# Altium footprint library EXTRA.PcbLib: 19 footprints (part 2 of 2)
Each footprint in its own frame and in the unit in brackets; x right, y up, seen from the top. Pads: shape width x height; smd on the part's side, far side on the other; paste and mask are expansions set on the pad; w line width, h text height; cw(c..) or ccw(c..) is an arc to the next point about the centre after c.
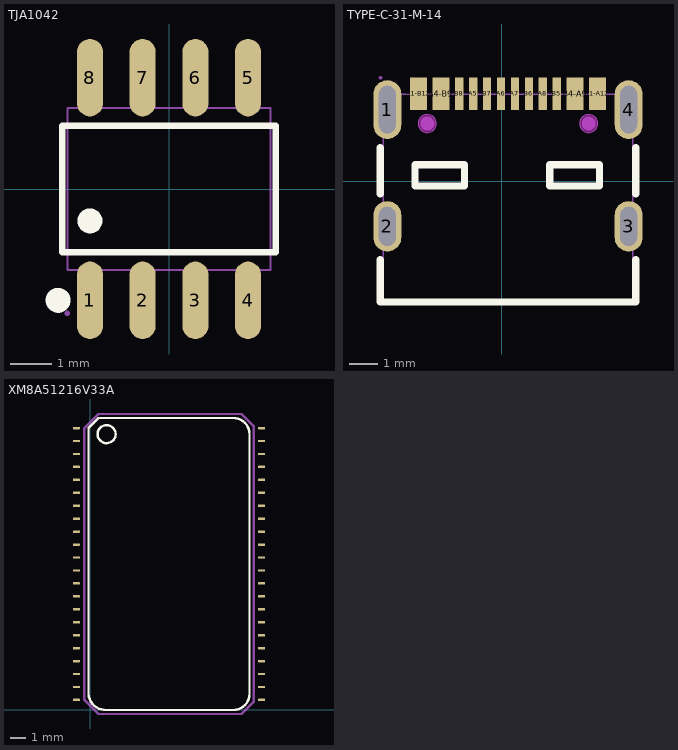
[diagram p1: the footprints below, top view; thin cyan lines are the x and y axes]

## TJA1042 [mm] "CAN PHY芯片，最高速度1M"
pads (8):
  oval 0.63x1.865 smd: 1(-1.905,-2.682) 2(-0.635,-2.682) 3(0.635,-2.682) 4(1.905,-2.682) 5(1.905,2.682) 6(0.635,2.682) 7(-0.635,2.682) 8(-1.905,2.682)
Top Overlay:
  circle w0.3: c-2.672,-2.682 r0.15
  circle w0.3: c-1.905,-0.769 r0.15
  lines w0.152: -2.576,-1.521 2.576,-1.521 2.576,1.521 -2.576,1.521 -2.576,-1.521
Mechanical 15:
  region: -2.115,-3 -2.115,-2.165 -1.695,-2.165 -1.695,-3
  region: -2.115,-2.175 -2.115,-1.94 -1.695,-1.94 -1.695,-2.175
  region: -0.845,-3 -0.845,-2.165 -0.425,-2.165 -0.425,-3
  region: -0.845,-2.175 -0.845,-1.94 -0.425,-1.94 -0.425,-2.175
  region: 0.425,-3 0.425,-2.165 0.845,-2.165 0.845,-3
  region: 0.425,-2.175 0.425,-1.94 0.845,-1.94 0.845,-2.175
  region: 1.695,-3 1.695,-2.165 2.115,-2.165 2.115,-3
  region: 1.695,-2.175 1.695,-1.94 2.115,-1.94 2.115,-2.175
  region: -2.115,2.165 -2.115,3 -1.695,3 -1.695,2.165
  region: -2.115,1.94 -2.115,2.175 -1.695,2.175 -1.695,1.94
  region: -0.845,2.165 -0.845,3 -0.425,3 -0.425,2.165
  region: -0.845,1.94 -0.845,2.175 -0.425,2.175 -0.425,1.94
  region: 0.425,2.165 0.425,3 0.845,3 0.845,2.165
  region: 0.425,1.94 0.425,2.175 0.845,2.175 0.845,1.94
  region: 1.695,2.165 1.695,3 2.115,3 2.115,2.165
  region: 1.695,1.94 1.695,2.175 2.115,2.175 2.115,1.94
  region: -2.39,-3 -2.39,-2.975 -2.425,-2.94 -2.475,-2.94 -2.51,-2.975 -2.51,-3 -2.51,-3.025 -2.475,-3.06 -2.425,-3.06 -2.39,-3.025
  lines w0.051: -2.45,-1.95 2.45,-1.95 2.45,1.95 -2.45,1.95 -2.45,-1.95
3D body "123.stp": height 1.67, standoff -0.05, extent -2.39,-3 2.425,3

## TYPE-C-31-M-14 [mm] "TYPE-C插头"
pads (16):
  oval 1x2.1 hole 0.6 slot 1.7 at 90 deg paste+0 mask+0.05: 1(-4.103,2.57) 4(4.537,2.57)
  oval 1x1.8 hole 0.6 slot 1.4 at 90 deg paste+0 mask+0.05: 2(-4.103,-1.61) 3(4.537,-1.61)
  rect 0.6x1.15 smd paste-100 mask+0.05: A1-B12(-2.983,3.134) A4-B9(-2.183,3.134) B1-A12(3.417,3.134) B4-A9(2.617,3.134)
  rect 0.3x1.15 smd paste-100 mask+0.05: A5(-1.033,3.134) A6(-0.033,3.134) A7(0.467,3.134) A8(1.467,3.134) B5(1.967,3.134) B6(0.967,3.134) B7(-0.533,3.134) B8(-1.533,3.134)
Top Overlay:
  lines w0.254: -4.355,-2.794 -4.355,-4.318 4.789,-4.318 4.789,-2.794 ; -4.355,-0.445 -4.355,1.206 ; 4.789,-0.445 4.789,1.206 ; -3.113,-0.168 -1.335,-0.168 -1.335,0.594 -3.113,0.594 -3.113,-0.168 ; 1.713,-0.168 3.491,-0.168 3.491,0.594 1.713,0.594 1.713,-0.168
Top Paste:
  drawing of 16 lines, arcs and shapes, not listed
Keep-Out Layer:
  board cut-out: 3.432,2.069 3.432,2.134 3.383,2.254 3.291,2.345 3.172,2.395 3.042,2.395 2.923,2.345 2.832,2.254 2.782,2.134 2.782,2.07 2.782,2.005 2.832,1.885 2.923,1.794 3.042,1.745 3.172,1.745 3.291,1.794 3.383,1.885 3.432,2.005
  board cut-out: -2.348,2.069 -2.348,2.134 -2.397,2.254 -2.489,2.345 -2.608,2.395 -2.738,2.395 -2.857,2.345 -2.948,2.254 -2.998,2.134 -2.998,2.07 -2.998,2.005 -2.949,1.885 -2.857,1.794 -2.738,1.745 -2.608,1.745 -2.489,1.794 -2.397,1.885 -2.348,2.005
Mechanical 1:
  circle w0.005: c3.107,2.069 r0.325
  circle w0.005: c-2.673,2.069 r0.325
Mechanical 6:
  circle w0.25: c3.107,2.069 r0.125
  circle w0.25: c-2.673,2.069 r0.125
Mechanical 15:
  region: -4.283,3.71 -4.283,3.734 -4.318,3.77 -4.368,3.77 -4.403,3.735 -4.403,3.71 -4.403,3.685 -4.368,3.65 -4.318,3.65 -4.283,3.685
  region: 4.387,3.118 4.687,3.118 4.687,2.018 4.387,2.018
  region: -4.253,3.118 -3.953,3.118 -3.953,2.018 -4.253,2.018
  region: 4.387,-1.21 4.687,-1.21 4.687,-2.01 4.387,-2.01
  region: -4.253,-1.21 -3.953,-1.21 -3.953,-2.01 -4.253,-2.01
  region: -1.633,3.498 -1.433,3.498 -1.433,2.748 -1.633,2.748
  region: -1.133,3.498 -0.933,3.498 -0.933,2.748 -1.133,2.748
  region: -0.633,3.498 -0.433,3.498 -0.433,2.748 -0.633,2.748
  region: -0.133,3.498 0.067,3.498 0.067,2.748 -0.133,2.748
  region: 0.367,3.498 0.567,3.498 0.567,2.748 0.367,2.748
  region: 0.867,3.498 1.067,3.498 1.067,2.748 0.867,2.748
  region: 1.367,3.498 1.567,3.498 1.567,2.748 1.367,2.748
  region: 1.867,3.498 2.067,3.498 2.067,2.748 1.867,2.748
  region: 2.392,3.498 2.842,3.498 2.842,2.748 2.392,2.748
  region: 3.192,3.498 3.642,3.498 3.642,2.748 3.192,2.748
  region: -2.408,3.498 -1.958,3.498 -1.958,2.748 -2.408,2.748
  region: -3.208,3.498 -2.758,3.498 -2.758,2.748 -3.208,2.748
  lines w0.051: -4.253,-4.232 -4.253,3.118 4.687,3.118 4.687,-4.232 -4.253,-4.232
Multi-Layer keep-out:
  region: 3.432,2.069 3.432,2.134 3.383,2.254 3.291,2.345 3.172,2.395 3.042,2.395 2.923,2.345 2.832,2.254 2.782,2.134 2.782,2.07 2.782,2.005 2.832,1.885 2.923,1.794 3.042,1.745 3.172,1.745 3.291,1.794 3.383,1.885 3.432,2.005
  region: -2.348,2.069 -2.348,2.134 -2.397,2.254 -2.489,2.345 -2.608,2.395 -2.738,2.395 -2.857,2.345 -2.948,2.254 -2.998,2.134 -2.998,2.07 -2.998,2.005 -2.949,1.885 -2.857,1.794 -2.738,1.745 -2.608,1.745 -2.489,1.794 -2.397,1.885 -2.348,2.005
3D body "TYPEC_3D.stp": height 3.2, standoff -0.9, extent -4.343,-4.061 4.597,3.839

## XM8A51216V33A [mm] "1M sramоƬ"
pads (44):
  rrect50% 0.45x0.15 smd: 1(-0.889,17.78) 2(-0.889,16.964) 3(-0.889,16.147) 4(-0.889,15.331) 5(-0.889,14.514) 6(-0.889,13.698) 7(-0.889,12.881) 8(-0.889,12.065) 9(-0.889,11.249) 10(-0.889,10.432) 11(-0.889,9.616) 12(-0.889,8.799) 13(-0.889,7.983) 14(-0.889,7.166) 15(-0.889,6.35) 16(-0.889,5.534) 17(-0.889,4.717) 18(-0.889,3.901) 19(-0.889,3.084) 20(-0.889,2.268) 21(-0.889,1.451) 22(-0.889,0.635) 23(10.795,0.635) 24(10.795,1.451) 25(10.795,2.268) 26(10.795,3.084) 27(10.795,3.901) 28(10.795,4.717) 29(10.795,5.534) 30(10.795,6.35) 31(10.795,7.166) 32(10.795,7.983) 33(10.795,8.799) 34(10.795,9.616) 35(10.795,10.432) 36(10.795,11.249) 37(10.795,12.065) 38(10.795,12.881) 39(10.795,13.698) 40(10.795,14.514) 41(10.795,15.331) 42(10.795,16.147) 43(10.795,16.964) 44(10.795,17.78)
Top Overlay:
  circle w0.152: c1.016,17.399 r0.568
  lines w0.152: 0.889,0 9.017,0 ccw(c9.017,1.016) 10.033,1.016 10.033,17.399 ccw(c9.017,17.399) 9.017,18.415 0.508,18.415 -0.127,17.78 -0.127,1.016 ccw(c0.953,1.079) 1.016,0
Mechanical 1:
  lines w0.152: -0.381,0.635 0.508,-0.254 9.525,-0.254 10.287,0.508 10.287,17.653 10.287,17.907 9.525,18.669 0.508,18.669 0.381,18.542 -0.254,17.907 -0.381,17.78 -0.381,0.635
3D body "SRAM.stp": height 1.1, standoff 0, extent -1.018,0.015 10.795,18.415